# Altium footprint library mobinbyn-Capacitor.PcbLib: 152 footprints (part 9 of 10)
Each footprint in its own frame and in the unit in brackets; x right, y up, seen from the top. Pads: shape width x height; smd on the part's side, far side on the other; paste and mask are expansions set on the pad; w line width, h text height; cw(c..) or ccw(c..) is an arc to the next point about the centre after c.
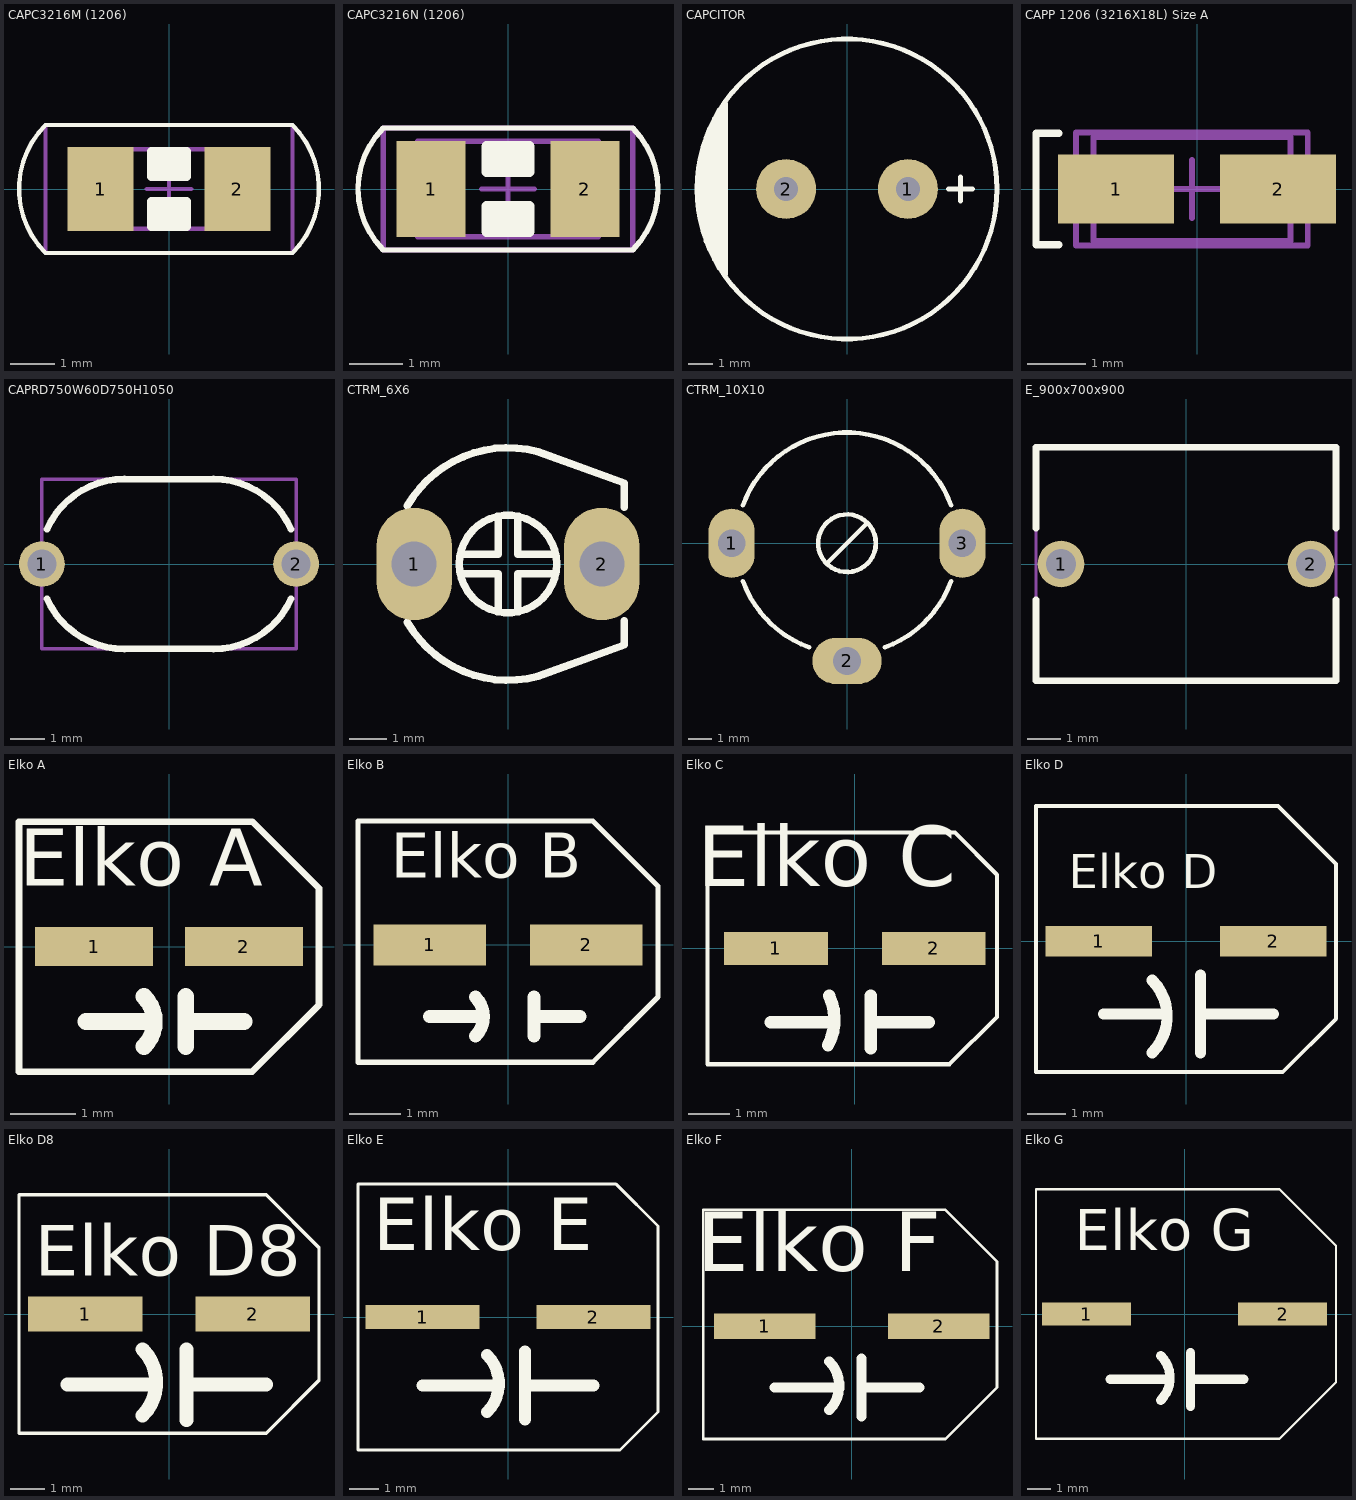
[diagram p8: the footprints below, top view; thin cyan lines are the x and y axes]

## CAPC3216M (1206) [mm] "Chip Capacitor, Body 3.2x1.6mm, IPC Low Density"
height 1.35
pads (2):
  rect 1.5x1.9 smd: 1(-1.55,0) 2(1.55,0)
Top Overlay:
  rectangle: -0.4,0.277 0.4,0.85
  rectangle: -0.4,-0.85 0.4,-0.277
  lines w0.1: -2.8,-1.45 cw(c-1.35,0) -2.8,1.45 2.8,1.45 cw(c1.35,0) 2.8,-1.45 -2.8,-1.45
  lines w0.2: -0.4,-0.85 0.4,-0.85 0.4,-0.277 -0.4,-0.277 -0.4,-0.85 ; -0.4,0.277 0.4,0.277 0.4,0.85 -0.4,0.85 -0.4,0.277
Mechanical 13:
  lines w0.1: -1.7,-0.9 1.7,-0.9 1.7,0.9 -1.7,0.9 -1.7,-0.9
Mechanical 15:
  lines w0.1: -0.5,0 0.5,0 ; 0,-0.5 0,0.5 ; -2.8,-1.45 2.8,-1.45 2.8,1.45 -2.8,1.45 -2.8,-1.45
3D body "cap 1206.STEP": height 0.75, standoff 0, extent -1.524,-0.762 1.524,0.762

## CAPC3216N (1206) [mm] "Chip Capacitor, Body 3.2x1.6mm, IPC Medium Density"
height 1.35
pads (2):
  rect 1.3x1.8 smd: 1(-1.45,0) 2(1.45,0)
Top Overlay:
  rectangle: -0.4,-0.8 0.4,-0.327
  rectangle: -0.4,0.327 0.4,0.8
  lines w0.1: -2.35,-1.15 cw(c-1.2,0) -2.35,1.15 2.35,1.15 cw(c1.2,0) 2.35,-1.15 -2.35,-1.15
  lines w0.2: -0.4,-0.8 -0.4,-0.327 0.4,-0.327 0.4,-0.8 -0.4,-0.8 ; -0.4,0.327 -0.4,0.8 0.4,0.8 0.4,0.327 -0.4,0.327
Mechanical 13:
  lines w0.1: -1.7,-0.9 -1.7,0.9 1.7,0.9 1.7,-0.9 -1.7,-0.9
Mechanical 15:
  lines w0.1: -0.5,0 0.5,0 ; 0,-0.5 0,0.5 ; -2.35,-1.15 -2.35,1.15 2.35,1.15 2.35,-1.15 -2.35,-1.15
3D body "cap 1206.STEP": height 0.75, standoff 0, extent -1.524,-0.762 1.524,0.762

## CAPCITOR [mm]
pads (2):
  round 2.5 hole 1: 1(2.54,0) 2(-2.54,0)
Top Overlay:
  circle w0.2: c0,0 r6.25
  lines w0.2: 4.22,0 5.236,0 ; 4.728,-0.508 4.728,0.508
  lines w0.254: -6.096,-0.889 -6.096,0.762 ; -5.969,-1.524 -5.969,1.524 ; -5.588,-2.413 -5.842,-2.159 -5.842,2.032 -5.588,2.286 ; -5.334,-2.921 -5.588,-2.667 -5.588,2.667 -5.334,2.921 -5.334,3.175 ; -5.207,-3.175 -5.334,-3.175 -5.334,3.175 ; -5.207,3.302 -5.334,3.175 ; -5.08,-3.556 -5.08,3.556
3D body "capcitor.STEP": height 25.4, standoff -3.75, extent -6.64,-6.6 6.56,6.6

## CAPP 1206 (3216X18L) Size A [mm] "Chip Capacitor, 2-Leads, Body 3.2x1.6mm, IPC High Density, chip Tantalum"
height 1.8
pads (2):
  rect 1.999x1.199 smd: 1(-1.4,0) 2(1.4,0)
Top Overlay:
  lines w0.127: -2.388,-0.965 -2.781,-0.965 -2.781,0.965 -2.388,0.965
Mechanical 13:
  lines w0.1: -1.789,-0.9 1.611,-0.9 1.611,0.9 -1.789,0.9 -1.789,-0.9
Mechanical 15:
  lines w0.1: -0.589,0 0.411,0 ; -0.089,-0.5 -0.089,0.5 ; -2.089,-0.975 -2.089,0.975 1.911,0.975 1.911,-0.975 -2.089,-0.975
3D body "SW3dPS-Solid Tantalum Chip Capacitor Size (A-3216-18).STEP": height 1.8, standoff 0, extent -1.828,-0.902 1.81,0.902

## CAPRD750W60D750H1050 [mm] "Vishay BC Components"
height 10.5
pads (2):
  round 1.35 hole 0.85: 1(-3.75,0) 2(3.75,0)
Top Overlay:
  lines w0.2: -3.6,-1.025 ccw(c-1.316,-0.008) -1.316,-2.508 ; -3.6,1.025 cw(c-1.316,0.008) -1.316,2.508 ; -1.5,-2.5 1.5,-2.5 ; -1.5,2.5 1.5,2.5 ; 1.316,-2.508 ccw(c1.316,-0.008) 3.6,-1.025 ; 1.316,2.508 cw(c1.316,0.008) 3.6,1.025
Mechanical 5:
  lines w0.1: -3.75,-2.5 -3.75,2.5 3.75,2.5 3.75,-2.5 -3.75,-2.5
3D body: height 10.5, standoff 3, extent -3.75,-2.5 3.75,2.5
3D body: height 6, standoff -2, extent -4.047,-0.299 -3.45,0.3
3D body: height 6, standoff -2, extent 3.453,-0.299 4.05,0.3

## CTRM_6X6 [mm] "CAP, TRIMMER, Murata TZ03"
pads (2):
  oval 2x3 hole 1.2: 1(-2.5,0) 2(2.5,0)
Top Overlay:
  circle w0.2: c0,0 r1.3
  lines w0.2: -2.685,-1.55 ccw(c0,0) 0.802,-2.994 3.1,-2.158 3.1,-1.519 ; -2.685,1.55 cw(c0,0) 0.802,2.994 3.1,2.158 3.1,1.519 ; -1.27,-0.254 -0.254,-0.254 -0.254,-1.27 ; -1.27,0.254 -0.254,0.254 -0.254,1.27 ; 0.254,-1.27 0.254,-0.254 1.27,-0.254 ; 0.254,1.27 0.254,0.254 1.27,0.254
3D body "User Library-Murata TZ03.step": height 4.8, standoff -3.3, extent -3,-3 3,3

## CTRM_10X10 [mm] "CAP, TRIMMER, 10X10mm 3P"
pads (3):
  oval 2x3 hole 1.2: 1(-5,0) 3(5,0)
  oval 3x2 hole 1.2: 2(0,-5.1)
Top Overlay:
  circle w0.2: c0,0 r1.25
  lines w0.2: -4.511,-1.642 ccw(c0,0) -1.642,-4.511 ; -4.511,1.642 cw(c0,0) 4.511,1.642 ; -0.889,-0.889 0.889,0.889 ; 1.642,-4.511 ccw(c0,0) 4.511,-1.642
3D body "User Library-TRIMMER,CAP.step": height 11.26, standoff -2.48, extent -5.029,-5.943 5.029,4.699

## E_900x700x900 [mm] "TH, 2- Leads, Body 9x7mm, Pin Spacing 7.5mm"
height 12
pads (2):
  round 1.4 hole 0.9: 1(-3.75,0) 2(3.75,0)
Top Overlay:
  lines w0.2: -4.5,-1.071 -4.5,-3.5 4.5,-3.5 4.5,-1.071 ; -4.5,1.071 -4.5,3.5 4.5,3.5 4.5,1.071
Mechanical 5:
  lines w0.1: -4.5,-3.5 4.5,-3.5 4.5,3.5 -4.5,3.5 -4.5,-3.5
3D body: height 0.3, standoff -2.5, extent -4.047,-0.299 -3.45,0.3
3D body: height 1.36, standoff -0.16, extent -4.047,-1.732 -3.45,0.3
3D body: height 6.12, standoff 0.81, extent -4.047,-1.732 -1.545,-1.033
3D body: height 6.12, standoff 0.81, extent 1.546,1.033 4.048,1.732
3D body: height 1.36, standoff -0.16, extent 3.45,-0.299 4.048,1.732
3D body: height 0.3, standoff -2.5, extent 3.45,-0.299 4.048,0.299
3D body: height 12, standoff 3, extent -4.5,-3.5 4.5,3.5

## Elko A [mm]
pads (2):
  rect 1.8x0.6 smd: 1(-1.143,0) 2(1.143,0)
Top Overlay:
  lines w0.1: -2.286,-1.905 -2.286,-0.254 -2.286,1.905 1.27,1.905 2.286,0.889 2.286,-0.508 2.286,-0.889 1.27,-1.905 -2.286,-1.905
  lines w0.254: -1.27,-1.143 -0.381,-1.143 ; -0.381,-1.524 ccw(c-0.762,-1.143) -0.381,-0.762 ; 0.254,-1.524 0.254,-0.762 ; 0.254,-1.143 1.143,-1.143
  text "Elko A" at -2.286,0.635 h1.5
3D body "User Library-ALU-A.STEP": height 5.4, standoff 0, extent -1.8,-1.65 1.8,1.65

## Elko B [mm]
pads (2):
  rect 2.2x0.8 smd: 1(-1.524,0) 2(1.524,0)
Top Overlay:
  lines w0.1: -2.921,-2.286 -2.921,2.413 1.651,2.413 2.921,1.143 2.921,-0.508 2.921,-1.016 1.651,-2.286 -2.921,-2.286
  lines w0.254: -1.524,-1.397 -0.635,-1.397 ; -0.635,-1.778 ccw(c-1.016,-1.397) -0.635,-1.016 ; 0.508,-1.778 0.508,-1.016 ; 0.508,-1.397 1.397,-1.397
  text "Elko B" at -2.286,1.016 h1.5
3D body "User Library-ALU-B.STEP": height 5.4, standoff 0, extent -2.3,-2.15 2.3,2.15

## Elko C [mm]
pads (2):
  rect 2.5x0.8 smd: 1(-1.905,0) 2(1.905,0)
Top Overlay:
  lines w0.1: -3.556,-2.794 -3.556,-0.762 -3.556,2.794 2.413,2.794 3.429,1.778 3.429,0.635 3.429,-1.651 2.286,-2.794 -1.905,-2.794 -3.556,-2.794
  lines w0.3: -2.032,-1.778 -0.508,-1.778 ; -0.648,-2.34 ccw(c-1.841,-1.714) -0.621,-1.145 ; 0.381,-2.413 0.381,-1.143 ; 0.381,-1.778 1.778,-1.778
  text "Elko C" at -3.81,1.016 h2.5
3D body "User Library-ALU-C.STEP": height 5.41, standoff 0, extent -2.95,-2.65 2.95,2.65

## Elko D [mm]
pads (2):
  rect 2.8x0.8 all layers, no hole: 1(-2.286,0) 2(2.286,0)
Top Overlay:
  lines w0.1: -3.937,-3.429 -3.937,3.556 2.413,3.556 3.937,2.032 3.937,-1.016 3.937,-2.032 2.54,-3.429 2.286,-3.429 -3.937,-3.429
  lines w0.3: -2.159,-1.905 -0.508,-1.905 ; -0.889,-2.921 ccw(c-1.841,-1.968) -0.889,-1.016 ; 0.381,-2.921 0.381,-0.889 ; 0.381,-1.905 2.286,-1.905
  text "Elko D" at -3.073,1.092 h1.52
3D body "User Library-ALU-D.STEP": height 5.4, standoff 0, extent -3.5,-3.3 3.5,3.3

## Elko D8 [mm]
pads (2):
  rect 3.3x1 smd: 1(-2.413,0) 2(2.413,0)
Top Overlay:
  lines w0.1: 4.318,1.143 4.318,1.905 2.794,3.429 -4.318,3.429 -4.318,-3.429 2.794,-3.429 4.318,-1.905 4.318,-0.889 4.318,1.27
  lines w0.4: -2.921,-2.032 -0.381,-2.032 ; -0.762,-2.921 ccw(c-1.714,-1.968) -0.762,-1.016 ; 0.508,-3.048 0.508,-1.016 ; 0.508,-2.032 2.794,-2.032
  text "Elko D8" at -3.861,0.61 h2.5
3D body "User Library-ALU-D8.STEP": height 7.7, standoff 0, extent -3.5,-3.3 3.5,3.3

## Elko E [mm]
pads (2):
  rect 3.8x0.8 smd: 1(-2.857,0) 2(2.857,0)
Top Overlay:
  lines w0.1: -5.016,-4.445 -5.016,4.445 3.619,4.445 5.016,3.048 5.016,1.27 5.016,0.254 5.016,-3.175 3.746,-4.445 1.841,-4.445 -5.016,-4.445
  lines w0.4: -2.857,-2.286 -0.318,-2.286 ; -0.699,-3.175 ccw(c-1.651,-2.222) -0.699,-1.27 ; 0.572,-3.429 0.572,-1.143 ; 0.572,-2.286 2.857,-2.286
  text "Elko E" at -4.508,1.651 h3
3D body "User Library-ALU-E.STEP": height 6.2, standoff 0, extent -4.436,-4.15 4.564,4.15

## Elko F [mm]
pads (2):
  rect 4x1 smd: 1(-3.429,0) 2(3.429,0)
Top Overlay:
  lines w0.1: -5.842,-4.445 3.683,-4.445 5.715,-2.413 5.715,-1.397 5.715,2.54 3.683,4.572 -5.842,4.572 -5.842,-4.445
  lines w0.4: -3.048,-2.413 -0.508,-2.413 ; -0.889,-3.302 ccw(c-1.841,-2.349) -0.889,-1.397 ; 0.381,-3.556 0.381,-1.27 ; 0.381,-2.413 2.667,-2.413
  text "Elko F" at -6.096,1.397 h4
3D body "User Library-ALU-F.STEP": height 10.2, standoff 0, extent -4.95,-4.15 4.95,4.15

## Elko G [mm]
pads (2):
  rect 3.8x1 smd: 1(-4.191,0) 2(4.191,0)
Top Overlay:
  lines w0.1: -6.35,-5.334 4.064,-5.334 6.477,-2.921 6.477,-1.016 6.477,2.921 4.064,5.334 -6.35,5.334 -6.35,-5.334
  lines w0.4: -3.175,-2.794 -0.635,-2.794 ; -1.016,-3.683 ccw(c-1.968,-2.73) -1.016,-1.778 ; 0.254,-3.937 0.254,-1.651 ; 0.254,-2.794 2.54,-2.794
  text "Elko G" at -4.699,2.159 h3
3D body "User Library-ALU-G.STEP": height 10.2, standoff 0, extent -5.8,-5.15 5.8,5.15